# Altium schematic symbol library NXP_60_26022015.SCHLIB: 1306 symbols (part 25 of 28) (continued)
## PESD24VS4UD
designator D?, comment Quadruple ESD protection diode arrays in a SOT457 package Quadruple ElectroStatic Discharge (ESD) protection diode arrays in a SOT457 (SC-74) small Surface-Mounted Device (SMD) plastic package designed to protect up to 4 signal lines from the damage caused by ESD and other transients.    AAL Eindhoven MK
footprint SOT457
pins: 1 K1, 2 5 CA, 3 K2, 4 K3, 6 K4

## PESD24VS5UD
designator U?, comment Fivefold ESD protection diode arrays Fivefold ElectroStatic Discharge (ESD) protection diode arrays in a SOT457 (SC-74) small Surface-Mounted Device (SMD) plastic package designed to protect up to ﬁve signal lines from the damage caused by ESD and other transients.    AAL Eindhoven MK
footprint SOT457
pins: 1 K1, 2 CA, 3 K2, 4 K3, 5 K4, 6 K5

## PESD24VU1UT
designator D?, comment Ultra low capacitance ESD protection diode in SOT23 package Ultra low capacitance ElectroStatic Discharge (ESD) protection diode in a SOT23 (TO-236AB) small SMD plastic package designed to protect one high-speed data line from the damage caused by ESD and other transients.    AAL Eindhoven MK
footprint SOT23
pins: 1 KESD, 2 KD, 3 CA

## PHT6NQ10T
designator T?, comment N-channel TrenchMOS(tm) transistor N-channel enhancement mode field-effect transistor in a plastic envelope using ’trench’ technology.    AAL Eindhoven MK
footprint SOT223
pins: 1 G, 2 4 D, 3 S

## PMBD353
designator D?, comment Schottky barrier double diode  Planar Schottky barrier double diode in a SOT23 small plastic SMD package.   AAL Eindhoven MK
footprint SOT23
pins: 1 K2, 2 A1, 3 K1A2

## PMBD354
designator D?, comment Schottky barrier double diode  Planar Schottky barrier double diode in a SOT23 small plastic SMD package.   AAL Eindhoven MK
footprint SOT23
pins: 1 K2, 2 A1, 3 K1A2

## PMBT5401
designator ?, comment PNP high-voltage transistor   AAL Eindhoven MK
footprint SOT23
pins: 1 B, 2 E, 3 C

## PMBT5550
designator T?, comment NPN high-voltage transistor    AAL Eindhoven MK
footprint SOT23
pins: 1 B, 2 E, 3 C

## PMBT5551
designator T?, comment NPN high-voltage transistor NPN high-voltage transistor in a SOT23 plastic package. PNP complement: PMBT5401.    AAL Eindhoven MK
footprint SOT23
pins: 1 B, 2 E, 3 C

## PMDPB58UPE
designator T?, comment 20 V dual P-channel Trench MOSFET  Dual small-signal P-channel enhancement mode Field-Effect Transistor (FET) in a leadless medium power DFN2020-6 (SOT1118) Surface-Mounted Device (SMD) plastic package using Trench MOSFET technology.   AAL Eindhoven MK
footprint SOT1118
part A pins: 1 S, 2 G, 6 7 D
part B pins: 3 D, 4 8 S, 5 G

## PMDPB80XP
designator T?, comment 20 V, dual P-channel Trench MOSFET   AAL Eindhoven MK
footprint SOT1118
part A pins: 1 S, 2 G, 6 7 D
part B pins: 3 8 D, 4 S, 5 G

## PMDXB950UPE
designator T?, comment 20 V, dual P-channel Trench MOSFET Dual P-channel enhancement mode Field-Effect Transistor (FET) in a leadless ultra small DFN1010B-6 (SOT1216) Surface-Mounted Device (SMD) plastic package using Trench MOSFET technology.    AAL Eindhoven MK
footprint SOT1216
part A pins: 1 S, 2 G, 6 D
part B pins: 3 D, 4 S, 5 G

## PMEG45A10EPD
designator D?, comment 45 V, 10 A low VF MEGA Schottky barrier rectifier Planar Maximum Efficiency General Application (MEGA) Schottky barrier rectifier with an integrated guard ring for stress protection, encapsulated in a SOT1289 (CFP15) power and flat lead Surface-Mounted Device (SMD) plastic package.    AAL Eindhoven MK
12NC: 9340 682 05146
footprint SOT1289
pins: 1 2 A, 3 K

## PMEG050V150EPD
designator D?, comment 50 V, 15 A low VF MEGA Schottky barrier rectifier Planar Maximum Efficiency General Application (MEGA) Schottky barrier rectifier with an integrated guard ring for stress protection, encapsulated in a CFP15 (SOT1289) power and flat lead Surface-Mounted Device (SMD) plastic package.   AAL Eindhoven MK
footprint SOT1289
pins: 1 2 A, 3 K

## PMEG1020EA
designator D?, comment 10 V, 2 A ultra low VF MEGA Schottky barrier rectifiers Planar Maximum Efficiency General Application (MEGA) Schottky barrier rectifiers with an integrated guard ring for stress protection, encapsulated in small and flat lead plastic SMD packages.   AAL Eindhoven MK
footprint SOD323(F)
pins: 1 K, 2 A

## PMEG1020EH
designator D?, comment 10 V, 2 A ultra low VF MEGA Schottky barrier rectifiers Planar Maximum Efficiency General Application (MEGA) Schottky barrier rectifiers with an integrated guard ring for stress protection, encapsulated in small and flat lead plastic SMD packages.   AAL Eindhoven MK
footprint SOD123F
pins: 1 K, 2 A

## PMEG1020EJ
designator D?, comment 10 V, 2 A ultra low VF MEGA Schottky barrier rectifiers Planar Maximum Efficiency General Application (MEGA) Schottky barrier rectifiers with an integrated guard ring for stress protection, encapsulated in small and flat lead plastic SMD packages.   AAL Eindhoven MK
footprint SOD323(F)
pins: 1 K, 2 A

## PMEG1020EV
designator D?, comment 10 V, 2 A ultra low VF MEGA Schottky barrier rectifiers Planar Maximum Efficiency General Application (MEGA) Schottky barrier rectifiers with an integrated guard ring for stress protection, encapsulated in small and flat lead plastic SMD packages.   AAL Eindhoven MK
footprint SOT666
pins: 1 2 5 6 K, 3 4 A

## PMEG1030EA
designator D?, comment 10 V, 3 A ultra low VF MEGA Schottky barrier rectifiers Planar Maximum Efficiency General Application (MEGA) Schottky barrier rectifiers with an integrated guard ring for stress protection, encapsulated in small and flat lead plastic SMD packages.   AAL Eindhoven MK
footprint SOD323(F)
pins: 1 K, 2 A

## PMEG1030EH
designator D?, comment 10 V, 3 A ultra low VF MEGA Schottky barrier rectifiers Planar Maximum Efficiency General Application (MEGA) Schottky barrier rectifiers with an integrated guard ring for stress protection, encapsulated in small and flat lead plastic SMD packages.   AAL Eindhoven MK
footprint SOD123F
pins: 1 K, 2 A

## PMEG1030EJ
designator D?, comment 10 V, 3 A ultra low VF MEGA Schottky barrier rectifiers Planar Maximum Efficiency General Application (MEGA) Schottky barrier rectifiers with an integrated guard ring for stress protection, encapsulated in small and flat lead plastic SMD packages.   AAL Eindhoven MK
footprint SOD323(F)
pins: 1 K, 2 A

## PMEG2002ESF
designator D?, comment 20 V, 0.2 A low VF MEGA Schottky barrier rectifier Planar Maximum Efficiency General Application (MEGA) Schottky barrier rectifier with an integrated guard ring for stress protection in a DSN0603-2 (SOD962-2) leadless ultra small Surface-Mounted Device (SMD) package.    AAL Eindhoven MK
footprint SOD962
pins: 1 K, 2 A

## PMEG2005AEA
designator D?, comment 20 V, 0.5 A low VF MEGA Schottky barrier rectifier  Planar Maximum Efficiency General Application (MEGA) Schottky barrier rectifier with an integrated guard ring for stress protection, encapsulated in a Surface-Mounted Device (SMD)     AAL Eindhoven MK
footprint SOD323(F)
pins: 1 K, 2 A

## PMEG2005AEV
designator D?, comment 20 V, 0.5 A low VF MEGA Schottky barrier rectifier  Planar Maximum Efficiency General Application (MEGA) Schottky barrier rectifier with an integrated guard ring for stress protection, encapsulated in a Surface-Mounted Device (SMD)     AAL Eindhoven MK
footprint SOT666
pins: 1 2 5 6 K, 3 4 A

## PMEG2005CT
designator D?, comment 500 mA low VF dual MEGA Schottky barrier rectifier  Planar Maximum Efficiency General Application (MEGA) Schottky barrier rectifier in common cathode configuration with an integrated guard ring for stress protection, encapsulated in a SOT23 (TO-236AB) small Surface-Mounted Device (SMD) plastic package.   AAL Eindhoven MK
FARNELL: 1972710
footprint SOT23
pins: 1 A1, 2 A2, 3 K1K2

## PMEG2005EB
designator D?, comment 20 V, 0.5 A low VF MEGA Schottky barrier rectifier  Planar Maximum Efficiency General Application (MEGA) Schottky barrier rectifier with an integrated guard ring for stress protection, encapsulated in a Surface-Mounted Device (SMD)     AAL Eindhoven MK
footprint SOD523
pins: 1 K, 2 A

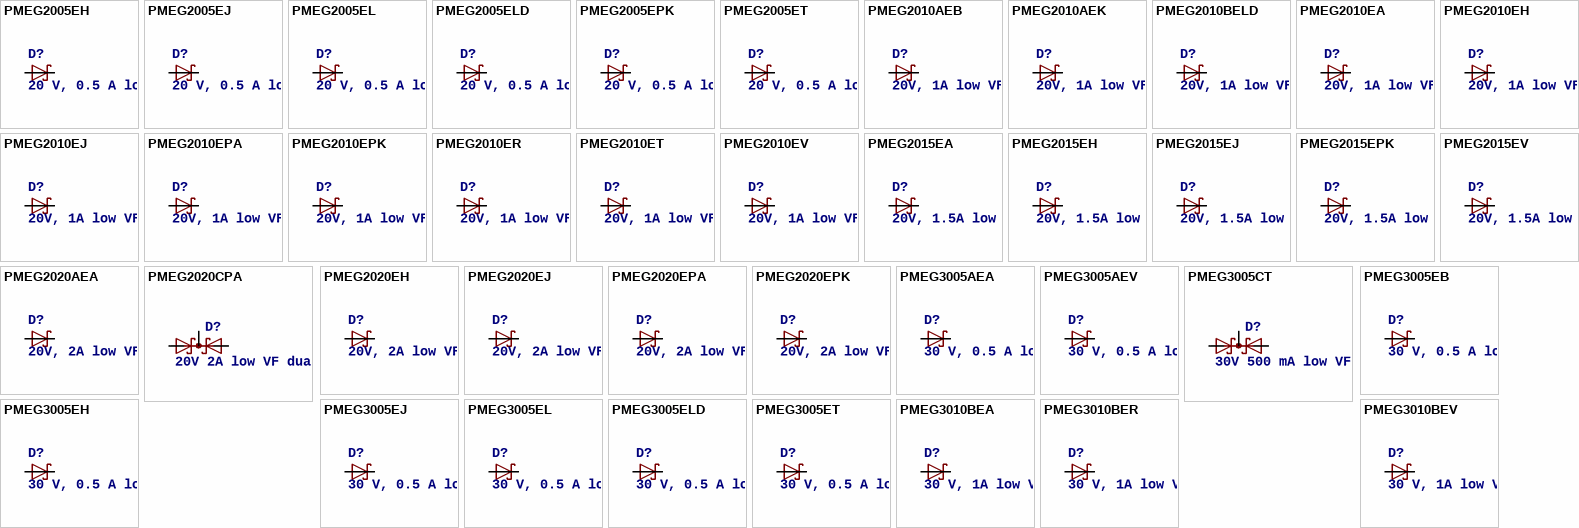
[diagram p169: symbols PMEG2005EH to PMEG3010BEV]

## PMEG2005EH
designator D?, comment 20 V, 0.5 A low VF MEGA Schottky barrier rectifier  Planar Maximum Efficiency General Application (MEGA) Schottky barrier rectifier with an integrated guard ring for stress protection, encapsulated in a Surface-Mounted Device (SMD)     AAL Eindhoven MK
footprint SOD123F
pins: 1 K, 2 A

## PMEG2005EJ
designator D?, comment 20 V, 0.5 A low VF MEGA Schottky barrier rectifier  Planar Maximum Efficiency General Application (MEGA) Schottky barrier rectifier with an integrated guard ring for stress protection, encapsulated in a Surface-Mounted Device (SMD)     AAL Eindhoven MK
footprint SOD323(F)
pins: 1 K, 2 A

## PMEG2005EL
designator D?, comment 20 V, 0.5 A low VF MEGA Schottky barrier rectifier  Planar Maximum Efficiency General Application (MEGA) Schottky barrier rectifier with an integrated guard ring for stress protection, encapsulated in a Surface-Mounted Device (SMD)     AAL Eindhoven MK
footprint SOD882(T)
pins: 1 K, 2 A

## PMEG2005ELD
designator D?, comment 20 V, 0.5 A low VF MEGA Schottky barrier rectifier  Planar Maximum Efficiency General Application (MEGA) Schottky barrier rectifier with an integrated guard ring for stress protection, encapsulated in a Surface-Mounted Device (SMD)     AAL Eindhoven MK
footprint SOD882D
pins: 1 K, 2 A

## PMEG2005EPK
designator D?, comment 20 V, 0.5 A low VF MEGA Schottky barrier rectifier  Planar Maximum Efficiency General Application (MEGA) Schottky barrier rectifier with an integrated guard ring for stress protection, encapsulated in a Surface-Mounted Device (SMD)     AAL Eindhoven MK
footprint SOD1608
pins: 1 K, 2 A

## PMEG2005ET
designator D?, comment 20 V, 0.5 A low VF MEGA Schottky barrier rectifier  Planar Maximum Efficiency General Application (MEGA) Schottky barrier rectifier with an integrated guard ring for stress protection, encapsulated in a Surface-Mounted Device (SMD)     AAL Eindhoven MK
footprint SOT23
pins: 1 A, 3 K

## PMEG2010AEB
designator D?, comment 20V, 1A low VF MEGA Schottky barrier rectifier  Planar Maximum Efficiency General Application (MEGA) Schottky barrier rectifier with an integrated guard ring for stress protection, encapsulated in a Surface-Mounted Device (SMD)     AAL Eindhoven MK
footprint SOD523
pins: 1 K, 2 A

## PMEG2010AEK
designator D?, comment 20V, 1A low VF MEGA Schottky barrier rectifier  Planar Maximum Efficiency General Application (MEGA) Schottky barrier rectifier with an integrated guard ring for stress protection, encapsulated in a Surface-Mounted Device (SMD)     AAL Eindhoven MK
REMARK: OBSOLETE
footprint SOT346
pins: 1 A, 3 K

## PMEG2010BELD
designator D?, comment 20V, 1A low VF MEGA Schottky barrier rectifier  Planar Maximum Efficiency General Application (MEGA) Schottky barrier rectifier with an integrated guard ring for stress protection, encapsulated in a Surface-Mounted Device (SMD)     AAL Eindhoven MK
footprint SOD882D
pins: 1 K, 2 A

## PMEG2010EA
designator D?, comment 20V, 1A low VF MEGA Schottky barrier rectifier  Planar Maximum Efficiency General Application (MEGA) Schottky barrier rectifier with an integrated guard ring for stress protection, encapsulated in a Surface-Mounted Device (SMD)     AAL Eindhoven MK
footprint SOD323(F)
pins: 1 K, 2 A

## PMEG2010EH
designator D?, comment 20V, 1A low VF MEGA Schottky barrier rectifier  Planar Maximum Efficiency General Application (MEGA) Schottky barrier rectifier with an integrated guard ring for stress protection, encapsulated in a Surface-Mounted Device (SMD)     AAL Eindhoven MK
footprint SOD123F
pins: 1 K, 2 A

## PMEG2010EJ
designator D?, comment 20V, 1A low VF MEGA Schottky barrier rectifier  Planar Maximum Efficiency General Application (MEGA) Schottky barrier rectifier with an integrated guard ring for stress protection, encapsulated in a Surface-Mounted Device (SMD)     AAL Eindhoven MK
footprint SOD323(F)
pins: 1 K, 2 A

## PMEG2010EPA
designator D?, comment 20V, 1A low VF MEGA Schottky barrier rectifier  Planar Maximum Efficiency General Application (MEGA) Schottky barrier rectifier with an integrated guard ring for stress protection, encapsulated in a Surface-Mounted Device (SMD)     AAL Eindhoven MK
footprint SOT1061
pins: 1 2 A, 3 K

## PMEG2010EPK
designator D?, comment 20V, 1A low VF MEGA Schottky barrier rectifier  Planar Maximum Efficiency General Application (MEGA) Schottky barrier rectifier with an integrated guard ring for stress protection, encapsulated in a Surface-Mounted Device (SMD)     AAL Eindhoven MK
footprint SOD1608
pins: 1 K, 2 A

## PMEG2010ER
designator D?, comment 20V, 1A low VF MEGA Schottky barrier rectifier  Planar Maximum Efficiency General Application (MEGA) Schottky barrier rectifier with an integrated guard ring for stress protection, encapsulated in a Surface-Mounted Device (SMD)     AAL Eindhoven MK
footprint SOD123W
pins: 1 K, 2 A

## PMEG2010ET
designator D?, comment 20V, 1A low VF MEGA Schottky barrier rectifier  Planar Maximum Efficiency General Application (MEGA) Schottky barrier rectifier with an integrated guard ring for stress protection, encapsulated in a Surface-Mounted Device (SMD)     AAL Eindhoven MK
footprint SOT23
pins: 1 A, 3 K

## PMEG2010EV
designator D?, comment 20V, 1A low VF MEGA Schottky barrier rectifier  Planar Maximum Efficiency General Application (MEGA) Schottky barrier rectifier with an integrated guard ring for stress protection, encapsulated in a Surface-Mounted Device (SMD)     AAL Eindhoven MK
footprint SOT666
pins: 1 2 5 6 K, 3 4 A

## PMEG2015EA
designator D?, comment 20V, 1.5A low VF MEGA Schottky barrier rectifier  Planar Maximum Efficiency General Application (MEGA) Schottky barrier rectifier with an integrated guard ring for stress protection, encapsulated in a Surface-Mounted Device (SMD)     AAL Eindhoven MK
footprint SOD323(F)
pins: 1 K, 2 A

## PMEG2015EH
designator D?, comment 20V, 1.5A low VF MEGA Schottky barrier rectifier  Planar Maximum Efficiency General Application (MEGA) Schottky barrier rectifier with an integrated guard ring for stress protection, encapsulated in a Surface-Mounted Device (SMD)     AAL Eindhoven MK
footprint SOD123F
pins: 1 K, 2 A

## PMEG2015EJ
designator D?, comment 20V, 1.5A low VF MEGA Schottky barrier rectifier  Planar Maximum Efficiency General Application (MEGA) Schottky barrier rectifier with an integrated guard ring for stress protection, encapsulated in a Surface-Mounted Device (SMD)     AAL Eindhoven MK
footprint SOD323(F)
pins: 1 K, 2 A

## PMEG2015EPK
designator D?, comment 20V, 1.5A low VF MEGA Schottky barrier rectifier  Planar Maximum Efficiency General Application (MEGA) Schottky barrier rectifier with an integrated guard ring for stress protection, encapsulated in a Surface-Mounted Device (SMD)     AAL Eindhoven MK
footprint SOD1608
pins: 1 K, 2 A

## PMEG2015EV
designator D?, comment 20V, 1.5A low VF MEGA Schottky barrier rectifier  Planar Maximum Efficiency General Application (MEGA) Schottky barrier rectifier with an integrated guard ring for stress protection, encapsulated in a Surface-Mounted Device (SMD)     AAL Eindhoven MK
footprint SOT666
pins: 1 2 5 6 K, 3 4 A

## PMEG2020AEA
designator D?, comment 20V, 2A low VF MEGA Schottky barrier rectifier  Planar Maximum Efficiency General Application (MEGA) Schottky barrier rectifier with an integrated guard ring for stress protection, encapsulated in a Surface-Mounted Device (SMD)     AAL Eindhoven MK
footprint SOD323(F)
pins: 1 K, 2 A

## PMEG2020CPA
designator D?, comment 20V 2A low VF dual MEGA Schottky barrier rectifier  Planar Maximum Efficiency General Application (MEGA) Schottky barrier rectifier in common cathode configuration with an integrated guard ring for stress protection, encapsulated in a SOT1061 leadless small Surface-Mounted Device (SMD) plastic package with medium power capability.    AAL Eindhoven MK
footprint SOT1061
pins: 1 A1, 2 A2, 3 K1K2

## PMEG2020EH
designator D?, comment 20V, 2A low VF MEGA Schottky barrier rectifier  Planar Maximum Efficiency General Application (MEGA) Schottky barrier rectifier with an integrated guard ring for stress protection, encapsulated in a Surface-Mounted Device (SMD)     AAL Eindhoven MK
footprint SOD123F
pins: 1 K, 2 A

## PMEG2020EJ
designator D?, comment 20V, 2A low VF MEGA Schottky barrier rectifier  Planar Maximum Efficiency General Application (MEGA) Schottky barrier rectifier with an integrated guard ring for stress protection, encapsulated in a Surface-Mounted Device (SMD)     AAL Eindhoven MK
REMARK: OBSOLETE
footprint SOD323(F)
pins: 1 K, 2 A

## PMEG2020EPA
designator D?, comment 20V, 2A low VF MEGA Schottky barrier rectifier  Planar Maximum Efficiency General Application (MEGA) Schottky barrier rectifier with an integrated guard ring for stress protection, encapsulated in a Surface-Mounted Device (SMD)     AAL Eindhoven MK
footprint SOT1061
pins: 1 2 A, 3 K

## PMEG2020EPK
designator D?, comment 20V, 2A low VF MEGA Schottky barrier rectifier  Planar Maximum Efficiency General Application (MEGA) Schottky barrier rectifier with an integrated guard ring for stress protection, encapsulated in a Surface-Mounted Device (SMD)     AAL Eindhoven MK
footprint SOD1608
pins: 1 K, 2 A

## PMEG3005AEA
designator D?, comment 30 V, 0.5 A low VF MEGA Schottky barrier rectifier  Planar Maximum Efficiency General Application (MEGA) Schottky barrier rectifier with an integrated guard ring for stress protection, encapsulated in a Surface-Mounted Device (SMD)     AAL Eindhoven MK
footprint SOD323(F)
pins: 1 K, 2 A

## PMEG3005AEV
designator D?, comment 30 V, 0.5 A low VF MEGA Schottky barrier rectifier  Planar Maximum Efficiency General Application (MEGA) Schottky barrier rectifier with an integrated guard ring for stress protection, encapsulated in a Surface-Mounted Device (SMD)     AAL Eindhoven MK
footprint SOT666
pins: 1 2 5 6 K, 3 4 A

## PMEG3005CT
designator D?, comment 30V 500 mA low VF dual MEGA Schottky barrier rectifier  Planar Maximum Efficiency General Application (MEGA) Schottky barrier rectifier in common cathode configuration with an integrated guard ring for stress protection, encapsulated in a SOT23 (TO-236AB) small Surface-Mounted Device (SMD) plastic package.   AAL Eindhoven MK
footprint SOT23
pins: 1 A1, 2 A2, 3 K1K2

## PMEG3005EB
designator D?, comment 30 V, 0.5 A low VF MEGA Schottky barrier rectifier  Planar Maximum Efficiency General Application (MEGA) Schottky barrier rectifier with an integrated guard ring for stress protection, encapsulated in a Surface-Mounted Device (SMD)     AAL Eindhoven MK
footprint SOD523
pins: 1 K, 2 A

## PMEG3005EH
designator D?, comment 30 V, 0.5 A low VF MEGA Schottky barrier rectifier  Planar Maximum Efficiency General Application (MEGA) Schottky barrier rectifier with an integrated guard ring for stress protection, encapsulated in a Surface-Mounted Device (SMD)     AAL Eindhoven MK
footprint SOD123F
pins: 1 K, 2 A

## PMEG3005EJ
designator D?, comment 30 V, 0.5 A low VF MEGA Schottky barrier rectifier  Planar Maximum Efficiency General Application (MEGA) Schottky barrier rectifier with an integrated guard ring for stress protection, encapsulated in a Surface-Mounted Device (SMD)     AAL Eindhoven MK
footprint SOD323(F)
pins: 1 K, 2 A

## PMEG3005EL
designator D?, comment 30 V, 0.5 A low VF MEGA Schottky barrier rectifier  Planar Maximum Efficiency General Application (MEGA) Schottky barrier rectifier with an integrated guard ring for stress protection, encapsulated in a Surface-Mounted Device (SMD)     AAL Eindhoven MK
footprint SOD882(T)
pins: 1 K, 2 A

## PMEG3005ELD
designator D?, comment 30 V, 0.5 A low VF MEGA Schottky barrier rectifier  Planar Maximum Efficiency General Application (MEGA) Schottky barrier rectifier with an integrated guard ring for stress protection, encapsulated in a Surface-Mounted Device (SMD)     AAL Eindhoven MK
footprint SOD882D
pins: 1 K, 2 A

## PMEG3005ET
designator D?, comment 30 V, 0.5 A low VF MEGA Schottky barrier rectifier  Planar Maximum Efficiency General Application (MEGA) Schottky barrier rectifier with an integrated guard ring for stress protection, encapsulated in a Surface-Mounted Device (SMD)     AAL Eindhoven MK
footprint SOT23
pins: 1 A, 3 K

## PMEG3010BEA
designator D?, comment 30 V, 1A low VF MEGA Schottky barrier rectifier  Planar Maximum Efficiency General Application (MEGA) Schottky barrier rectifier with an integrated guard ring for stress protection, encapsulated in a Surface-Mounted Device (SMD)     AAL Eindhoven MK
footprint SOD323(F)
pins: 1 K, 2 A

## PMEG3010BER
designator D?, comment 30 V, 1A low VF MEGA Schottky barrier rectifier  Planar Maximum Efficiency General Application (MEGA) Schottky barrier rectifier with an integrated guard ring for stress protection, encapsulated in a Surface-Mounted Device (SMD)     AAL Eindhoven MK
footprint SOD123W
pins: 1 K, 2 A

## PMEG3010BEV
designator D?, comment 30 V, 1A low VF MEGA Schottky barrier rectifier  Planar Maximum Efficiency General Application (MEGA) Schottky barrier rectifier with an integrated guard ring for stress protection, encapsulated in a Surface-Mounted Device (SMD)     AAL Eindhoven MK
footprint SOT666
pins: 1 2 5 6 K, 3 4 A

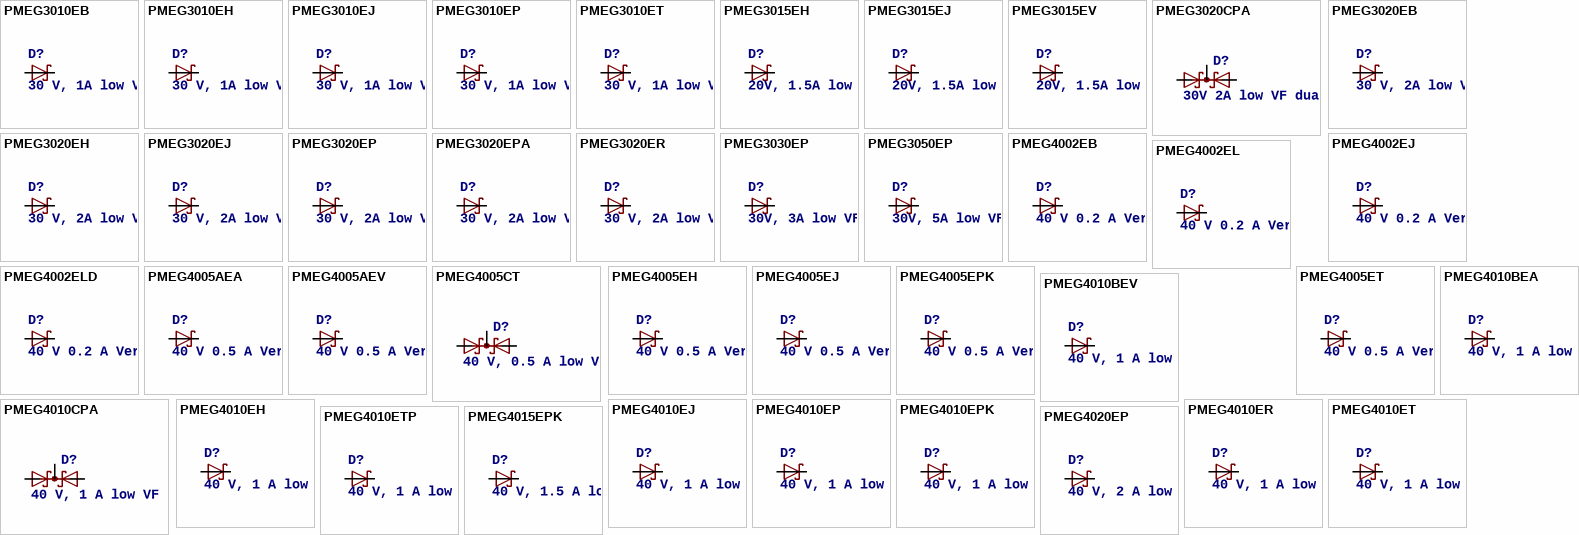
[diagram p170: symbols PMEG3010EB to PMEG4020EP]

## PMEG3010EB
designator D?, comment 30 V, 1A low VF MEGA Schottky barrier rectifier  Planar Maximum Efficiency General Application (MEGA) Schottky barrier rectifier with an integrated guard ring for stress protection, encapsulated in a Surface-Mounted Device (SMD)     AAL Eindhoven MK
footprint SOD523
pins: 1 K, 2 A

## PMEG3010EH
designator D?, comment 30 V, 1A low VF MEGA Schottky barrier rectifier  Planar Maximum Efficiency General Application (MEGA) Schottky barrier rectifier with an integrated guard ring for stress protection, encapsulated in a Surface-Mounted Device (SMD)     AAL Eindhoven MK
footprint SOD123F
pins: 1 K, 2 A

## PMEG3010EJ
designator D?, comment 30 V, 1A low VF MEGA Schottky barrier rectifier  Planar Maximum Efficiency General Application (MEGA) Schottky barrier rectifier with an integrated guard ring for stress protection, encapsulated in a Surface-Mounted Device (SMD)     AAL Eindhoven MK
footprint SOD323(F)
pins: 1 K, 2 A

## PMEG3010EP
designator D?, comment 30 V, 1A low VF MEGA Schottky barrier rectifier  Planar Maximum Efficiency General Application (MEGA) Schottky barrier rectifier with an integrated guard ring for stress protection, encapsulated in a Surface-Mounted Device (SMD)     AAL Eindhoven MK
footprint SOD128
pins: 1 K, 2 A

## PMEG3010ET
designator D?, comment 30 V, 1A low VF MEGA Schottky barrier rectifier  Planar Maximum Efficiency General Application (MEGA) Schottky barrier rectifier with an integrated guard ring for stress protection, encapsulated in a Surface-Mounted Device (SMD)     AAL Eindhoven MK
footprint SOT23
pins: 1 A, 3 K

## PMEG3015EH
designator D?, comment 20V, 1.5A low VF MEGA Schottky barrier rectifier  Planar Maximum Efficiency General Application (MEGA) Schottky barrier rectifier with an integrated guard ring for stress protection, encapsulated in a Surface-Mounted Device (SMD)     AAL Eindhoven MK
footprint SOD123F
pins: 1 K, 2 A

## PMEG3015EJ
designator D?, comment 20V, 1.5A low VF MEGA Schottky barrier rectifier  Planar Maximum Efficiency General Application (MEGA) Schottky barrier rectifier with an integrated guard ring for stress protection, encapsulated in a Surface-Mounted Device (SMD)     AAL Eindhoven MK
footprint SOD323(F)
pins: 1 K, 2 A

## PMEG3015EV
designator D?, comment 20V, 1.5A low VF MEGA Schottky barrier rectifier  Planar Maximum Efficiency General Application (MEGA) Schottky barrier rectifier with an integrated guard ring for stress protection, encapsulated in a Surface-Mounted Device (SMD)     AAL Eindhoven MK
footprint SOT666
pins: 1 2 5 6 K, 3 4 A

## PMEG3020CPA
designator D?, comment 30V 2A low VF dual MEGA Schottky barrier rectifier  Planar Maximum Efficiency General Application (MEGA) Schottky barrier rectifier in common cathode configuration with an integrated guard ring for stress protection, encapsulated in a SOT1061 leadless small Surface-Mounted Device (SMD) plastic package with medium power capability.    AAL Eindhoven MK
footprint SOT1061
pins: 1 A1, 2 A2, 3 K1K2

## PMEG3020EB
designator D?, comment 30 V, 2A low VF MEGA Schottky barrier rectifier  Planar Maximum Efficiency General Application (MEGA) Schottky barrier rectifier with an integrated guard ring for stress protection, encapsulated in a Surface-Mounted Device (SMD)     AAL Eindhoven MK
footprint SOD523
pins: 1 K, 2 A

## PMEG3020EH
designator D?, comment 30 V, 2A low VF MEGA Schottky barrier rectifier  Planar Maximum Efficiency General Application (MEGA) Schottky barrier rectifier with an integrated guard ring for stress protection, encapsulated in a Surface-Mounted Device (SMD)     AAL Eindhoven MK
footprint SOD123F
pins: 1 K, 2 A

## PMEG3020EJ
designator D?, comment 30 V, 2A low VF MEGA Schottky barrier rectifier  Planar Maximum Efficiency General Application (MEGA) Schottky barrier rectifier with an integrated guard ring for stress protection, encapsulated in a Surface-Mounted Device (SMD)     AAL Eindhoven MK
footprint SOD323(F)
pins: 1 K, 2 A

## PMEG3020EP
designator D?, comment 30 V, 2A low VF MEGA Schottky barrier rectifier  Planar Maximum Efficiency General Application (MEGA) Schottky barrier rectifier with an integrated guard ring for stress protection, encapsulated in a Surface-Mounted Device (SMD)     AAL Eindhoven MK
footprint SOD128
pins: 1 K, 2 A

## PMEG3020EPA
designator D?, comment 30 V, 2A low VF MEGA Schottky barrier rectifier  Planar Maximum Efficiency General Application (MEGA) Schottky barrier rectifier with an integrated guard ring for stress protection, encapsulated in a Surface-Mounted Device (SMD)     AAL Eindhoven MK
footprint SOT1061
pins: 1 2 A, 3 K

## PMEG3020ER
designator D?, comment 30 V, 2A low VF MEGA Schottky barrier rectifier  Planar Maximum Efficiency General Application (MEGA) Schottky barrier rectifier with an integrated guard ring for stress protection, encapsulated in a Surface-Mounted Device (SMD)     AAL Eindhoven MK
footprint SOD123W
pins: 1 K, 2 A

## PMEG3030EP
designator D?, comment 30V, 3A low VF MEGA Schottky barrier rectifier  Planar Maximum Efficiency General Application (MEGA) Schottky barrier rectifier with an integrated guard ring for stress protection, encapsulated in a Surface-Mounted Device (SMD)     AAL Eindhoven MK
footprint SOD128
pins: 1 K, 2 A

## PMEG3050EP
designator D?, comment 30V, 5A low VF MEGA Schottky barrier rectifier  Planar Maximum Efficiency General Application (MEGA) Schottky barrier rectifier with an integrated guard ring for stress protection, encapsulated in a Surface-Mounted Device (SMD)     AAL Eindhoven MK
footprint SOD128
pins: 1 K, 2 A

## PMEG4002EB
designator D?, comment 40 V 0.2 A Very low VF MEGA Schottky barrier rectifier  Planar Maximum Efficiency General Application (MEGA) Schottky barrier rectifier with an integrated guard ring for stress protection, encapsulated in a SOD323 (SC-76) very small SMD plastic packag   AAL Eindhoven MK
footprint SOD523
pins: 1 K, 2 A

## PMEG4002EJ
designator D?, comment 40 V 0.2 A Very low VF MEGA Schottky barrier rectifier  Planar Maximum Efficiency General Application (MEGA) Schottky barrier rectifier with an integrated guard ring for stress protection, encapsulated in a SOD323 (SC-76) very small SMD plastic packag   AAL Eindhoven MK
footprint SOD323(F)
pins: 1 K, 2 A

## PMEG4002EL
designator D?, comment 40 V 0.2 A Very low VF MEGA Schottky barrier rectifier  Planar Maximum Efficiency General Application (MEGA) Schottky barrier rectifier with an integrated guard ring for stress protection, encapsulated in a SOD323 (SC-76) very small SMD plastic packag   AAL Eindhoven MK
footprint SOD882(T)
pins: 1 K, 2 A

## PMEG4002ELD
designator D?, comment 40 V 0.2 A Very low VF MEGA Schottky barrier rectifier  Planar Maximum Efficiency General Application (MEGA) Schottky barrier rectifier with an integrated guard ring for stress protection, encapsulated in a SOD323 (SC-76) very small SMD plastic packag   AAL Eindhoven MK
footprint SOD882D
pins: 1 K, 2 A

## PMEG4005AEA
designator D?, comment 40 V 0.5 A Very low VF MEGA Schottky barrier rectifier  Planar Maximum Efficiency General Application (MEGA) Schottky barrier rectifier with an integrated guard ring for stress protection, encapsulated in a SOD323 (SC-76) very small SMD plastic packag   AAL Eindhoven MK
footprint SOD323(F)
pins: 1 K, 2 A

## PMEG4005AEV
designator D?, comment 40 V 0.5 A Very low VF MEGA Schottky barrier rectifier  Planar Maximum Efficiency General Application (MEGA) Schottky barrier rectifier with an integrated guard ring for stress protection, encapsulated in a SOD323 (SC-76) very small SMD plastic packag   AAL Eindhoven MK
footprint SOT666
pins: 1 2 5 6 K, 3 4 A

## PMEG4005CT
designator D?, comment 40 V, 0.5 A low VF MEGA Schottky barrier rectifier  Planar Maximum Efficiency General Application (MEGA) Schottky barrier rectifier with an integrated guard ring for stress protection, encapsulated in a leadless ultra small SOD1608 (DFN1608D-2) Surface-Mounted Device (SMD) plastic package with visible and solderable side pads     AAL Eindhoven MK
footprint SOT23
pins: 1 A1, 2 A2, 3 K1K2

## PMEG4005EH
designator D?, comment 40 V 0.5 A Very low VF MEGA Schottky barrier rectifier  Planar Maximum Efficiency General Application (MEGA) Schottky barrier rectifier with an integrated guard ring for stress protection, encapsulated in a SOD323 (SC-76) very small SMD plastic packag   AAL Eindhoven MK
footprint SOD123F
pins: 1 K, 2 A

## PMEG4005EJ
designator D?, comment 40 V 0.5 A Very low VF MEGA Schottky barrier rectifier  Planar Maximum Efficiency General Application (MEGA) Schottky barrier rectifier with an integrated guard ring for stress protection, encapsulated in a SOD323 (SC-76) very small SMD plastic packag   AAL Eindhoven MK
footprint SOD323(F)
pins: 1 K, 2 A

## PMEG4005EPK
designator D?, comment 40 V 0.5 A Very low VF MEGA Schottky barrier rectifier  Planar Maximum Efficiency General Application (MEGA) Schottky barrier rectifier with an integrated guard ring for stress protection, encapsulated in a SOD323 (SC-76) very small SMD plastic packag   AAL Eindhoven MK
footprint SOD1608
pins: 1 K, 2 A

## PMEG4005ET
designator D?, comment 40 V 0.5 A Very low VF MEGA Schottky barrier rectifier  Planar Maximum Efficiency General Application (MEGA) Schottky barrier rectifier with an integrated guard ring for stress protection, encapsulated in a SOD323 (SC-76) very small SMD plastic packag   AAL Eindhoven MK
footprint SOT23
pins: 1 A, 3 K

## PMEG4010BEA
designator D?, comment 40 V, 1 A low VF MEGA Schottky barrier rectifier  Planar Maximum Efficiency General Application (MEGA) Schottky barrier rectifier with an integrated guard ring for stress protection.     AAL Eindhoven MK
footprint SOD323(F)
pins: 1 K, 2 A

## PMEG4010BEV
designator D?, comment 40 V, 1 A low VF MEGA Schottky barrier rectifier  Planar Maximum Efficiency General Application (MEGA) Schottky barrier rectifier with an integrated guard ring for stress protection.     AAL Eindhoven MK
footprint SOT666
pins: 1 2 5 6 K, 3 4 A

## PMEG4010CPA
designator D?, comment 40 V, 1 A low VF MEGA Schottky barrier rectifier  Planar Maximum Efficiency General Application (MEGA) Schottky barrier rectifier with an integrated guard ring for stress protection, encapsulated in a leadless ultra small SOD1608 (DFN1608D-2) Surface-Mounted Device (SMD) plastic package with visible and solderable side pads     AAL Eindhoven MK
footprint SOT1061
pins: 1 A1, 2 A2, 3 K1K2

## PMEG4010EH
designator D?, comment 40 V, 1 A low VF MEGA Schottky barrier rectifier  Planar Maximum Efficiency General Application (MEGA) Schottky barrier rectifier with an integrated guard ring for stress protection.     AAL Eindhoven MK
footprint SOD123F
pins: 1 K, 2 A

## PMEG4010EJ
designator D?, comment 40 V, 1 A low VF MEGA Schottky barrier rectifier  Planar Maximum Efficiency General Application (MEGA) Schottky barrier rectifier with an integrated guard ring for stress protection.     AAL Eindhoven MK
footprint SOD323(F)
pins: 1 K, 2 A

## PMEG4010EP
designator D?, comment 40 V, 1 A low VF MEGA Schottky barrier rectifier  Planar Maximum Efficiency General Application (MEGA) Schottky barrier rectifier with an integrated guard ring for stress protection.     AAL Eindhoven MK
footprint SOD128
pins: 1 K, 2 A